# Altium schematic symbol library AA_Symbols.SchLib: 1017 symbols (part 3 of 7) (continued)
## IC_ADUM4160
designator U?, comment ADuM4160
IC, Isolator, USB, Full/Low Speed, 5kV; Manufacturer: Analog Devices; Manufacturer P/N: ADUM4160BRWZ; Outset P/N: 0000111
footprint SOIC_16PIN_WIDE (SOIC, 16-Leads, Body 10.5x7.6mm (max), Pitch 1.27mm, IPC Medium Density)
pins: 1 VBUS1, 2 GND1, 3 VDD1, 4 PDEN, 5 SPU, 6 UD-, 7 UD+, 8 GND1, 9 GND2, 10 DD+, 11 DD-, 12 PIN, 13 SPD, 14 VDD2, 15 GND2, 16 VBUS2

## IC_ADUM5000
designator U?, comment ADuM5000
IC, DC/DC Converter, Isolated, 2.5kV; Manufacturer: Analog Devices; Manufacturer P/N: ADUM5000ARWZ; Outset P/N: 0000112
footprint SOIC_16PIN_WIDE (SOIC, 16-Leads, Body 10.5x7.6mm (max), Pitch 1.27mm, IPC Medium Density)
pins: 1 VDD, 2 GND, 3 NC hidden, 4 RCin, 5 RCout, 6 RCsel, 7 VDD, 8 GND, 9 GNDiso, 10 Viso, 11 NC hidden, 12 NC hidden, 13 Vsel, 14 NC hidden, 15 GNDiso, 16 Viso

## IC_AK4432VT
designator U?, comment AK4432VT
IC, DAC/AUDIO 32BIT 192K 16TSSOP; Manufacturer P/N: LMZ14203HTZ/NOPB; Manufacturer: Texas Instruments; Outset P/N: PN-0001723; Value: AK4432VT
footprint SOP16P65_500X640X110L60X23N (Small Outline Pkg (SOP), 0.65 mm pitch; 16 pin, 5.00 mm L X 4.40 mm W X 1.10 mm H body)
pins: 1 MCLK (in), 2 BICK (in), 3 SDTI (in), 4 LRCK (in), 5 PDN (in), 6 SMUTE/CSN/I2CFIL (in), 7 AKS/CCLK/SCL (in), 8 DIF/CDTI/SDA, 9 P/S (in), 10 AOUTR (out), 11 AOUTL (out), 12 VCOM (out), 13 VSS (power), 14 AVDD (power), 15 LVDD (power), 16 LDOO (out)

## IC_AM26LV31IDR
designator U?, comment AM26LV31IDR
IC, 4/0 Driver RS422, RS485 16-SOIC; Manufacturer: Texas Instruments; Outset P/N: PN-0008395; Manufacturer P/N: AM26LV31IDR
footprint SOIC16P127_990X600X175L83X41N (Small Outline IC (SOIC), 1.27 mm pitch; 16 pin, 9.90 mm L X 3.90 mm W X 1.75 mm H body)
pins: 1 1A, 2 1Y, 3 1Z, 4 G, 5 2Z, 6 2Y, 7 2A, 8 VCC, 9 3A, 10 3Y, 11 3Z, 12 ~{G}, 13 4Z, 14 4Y, 15 4A, 16 GND

## IC_AM26LV31IDR_1
designator U?, comment AM26LV31IDR
IC, 4/0 Driver RS422, RS485 16-SOIC; Manufacturer: Texas Instruments; Manufacturer P/N: AM26LV31IDR
pins: 1 1A, 2 1Y, 3 1Z, 4 G, 5 2Z, 6 2Y, 7 2A, 8 VCC, 9 3A, 10 3Y, 11 3Z, 12 ~{G}, 13 4Z, 14 4Y, 15 4A, 16 GND

## IC_AP2112K-1.8TRG1
designator U?, comment AP2112K-1.8TRG1
IC, Linear Voltage Regulator IC Positive Fixed 1 Output 600mA SOT-25; Manufacturer: Diodes Incorporated; Outset P/N: PN-0008209; Value: AP2112K-1.8TRG1; Manufacturer P/N: AP2112K-1.8TRG1
footprint SOT23-5P95_285X140L45X42N (Small Outline Transistor, SOT-23 Type, 0.95 mm pitch; 5 pin, 3.00 mm L X 1.60 mm W X 1.40 mm H body)
pins: 1 VIN (power), 2 GND (power) "CH A", 3 EN (in), 4 NC, 5 VOUT (power) "GND"

## IC_AP7361C-Y5-13
designator U?, comment AP7361C-Y5-13
IC, Linear Regulator, Pos Adj, 1A, SOT89-5; Manufacturer: Diodes Incorporated; Outset P/N: PN-0007151; Manufacturer P/N: AP7361C-Y5-13; VALUE: AP7361C-Y5-13
footprint SOT89-5_Diodes_Inc_MFR
pins: 1 EN, 2 GND (power), 3 ADJ/NC, 4 VIN, 5 VOUT

## IC_AP22814AW5-7
designator U?, comment AP22814AW5-7
IC, Power Switch/Driver 1:1 P-Channel 3A SOT-25; Manufacturer: Diodes Inc; Outset P/N: PN-0007409; Manufacturer P/N: AP22814AW5-7; Value: AP22814AW5-7
footprint SOT23-5P95_280X145L45X40N (DBV_MO-178) (Small Outline Transistor (SOT23), 0.95 mm pitch; 5 pin, 2.90 mm L X 1.60 mm W X 1.45 mm H body)
pins: 1 OUT (power), 2 GND (power), 3 FLG, 4 EN, 5 IN (power)

## IC_BMP390
designator U?, comment BMP390
IC, SENSOR PRESSURE ABS; Manufacturer: Bosch Sensortec; Outset P/N: PN-0007204; VALUE: BMP390; Manufacturer P/N: BMP390
footprint PQFN10_BMP390 (Pull-back QFN)
pins: 1 VDDIO (power), 2 SCK (in), 3 VSS (power), 4 SDI (in), 5 SDO (out), 6 CSB (in), 7 INT (out), 8 VSS (power), 9 VSS (power), 10 VDD (power)

## IC_CAT25080YI-GT3
designator U?, comment CAT25080YI-GT3
IC, EEPROM 8Kbit, SPI, 20MHZ, 8TSSOP; Manufacturer: Onsemi; Outset P/N: PN-0007144; Manufacturer P/N: CAT25080YI-GT3; VALUE: CAT25080YI-GT3
footprint SOP8P65_300X640X120L62X24N (PW_MO-153AA)
pins: 1 ~{CS}, 2 SO (out), 3 ~{WP}, 4 VSS (power), 5 SI (in), 6 SCK, 7 ~{HOLD} (in), 8 VCC (power)

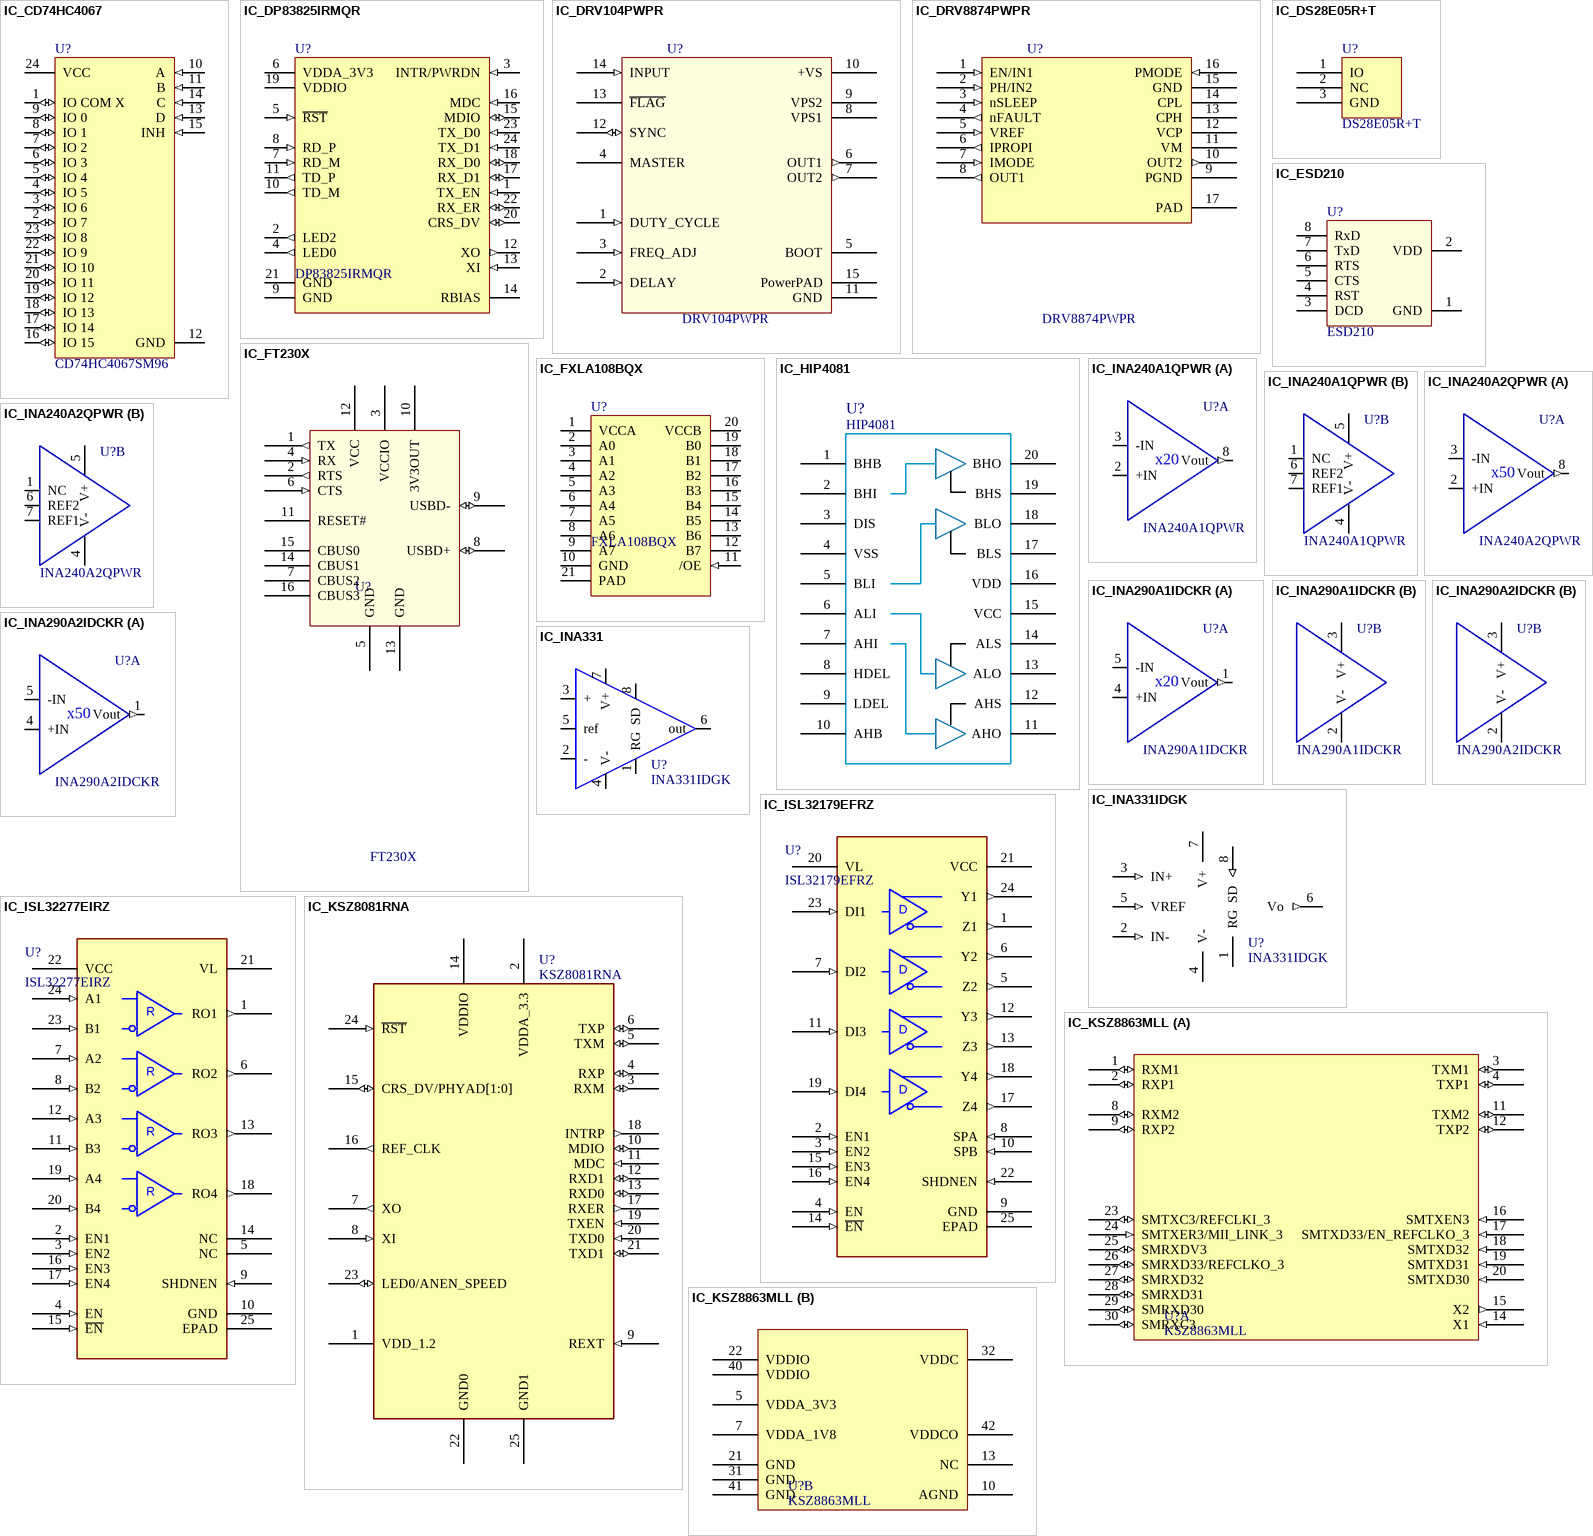
[diagram p18: symbols IC_CD74HC4067 to IC_KSZ8863MLL]

## IC_CD74HC4067
designator U?, comment CD74HC4067SM96
IC, Analog Multiplexer/Demultiplexer, 16:1; Manufacturer: Texas Instruments; Outset P/N: 0000113; Manufacturer P/N: CD74HC4067SM96
footprint SSOP_24PIN (SSOP, 24-Leads, Body 8.5x5.6mm (max), Pitch 0.65mm, IPC Medium Density)
pins: 1 IO COM X (io), 2 IO 7 (io), 3 IO 6 (io), 4 IO 5 (io), 5 IO 4 (io), 6 IO 3 (io), 7 IO 2 (io), 8 IO 1 (io), 9 IO 0 (io), 10 A (in), 11 B (in), 12 GND (power), 13 D (in), 14 C (in), 15 INH (in), 16 IO 15 (io), 17 IO 14 (io), 18 IO 13 (io), 19 IO 12 (io), 20 IO 11 (io), 21 IO 10 (io), 22 IO 9 (io), 23 IO 8 (io), 24 VCC (power)

## IC_DP83825IRMQR
designator U?, comment DP83825IRMQR
IC, 1/1 Transceiver Full, Half Ethernet, IEEE 802.3 24-WQFN (3x3); Manufacturer: Texas Instruments; Outset P/N: PN-0008210; Manufacturer P/N: DP83825IRMQR; Value: DP83825IRMQR
footprint QFN_DP83825IRMQR
pins: 1 TX_EN (in), 2 LED2 (out), 3 INTR/PWRDN (in), 4 LED0 (out), 5 ~{RST} (in), 6 VDDA_3V3 (power), 7 RD_M (in), 8 RD_P (in), 9 GND (power), 10 TD_M (out), 11 TD_P (out), 12 XO (out), 13 XI (in), 14 RBIAS, 15 MDIO (io), 16 MDC (in), 17 RX_D1 (io), 18 RX_D0 (io), 19 VDDIO (power), 20 CRS_DV (io), 21 GND (power), 22 RX_ER (io), 23 TX_D0 (in), 24 TX_D1 (in)

## IC_DRV104PWPR
designator U?, comment DRV104PWPR
IC, High-Side Driver, DRV104PWPR, 14-TSSOP; Manufacturer: Texas Instruments; Outset P/N: PN-0001646; Manufacturer P/N: DRV104PWPR; Value: DRV104PWPR
footprint DRV104PWPR_SOP65P640X120-15L25T246X231N (TSSOP, 24-Leads, Body 7.9x4.5mm (max), Pitch 0.65mm, IPC Medium Density)
pins: 1 DUTY_CYCLE (in), 2 DELAY (in), 3 FREQ_ADJ (in), 4 MASTER, 5 BOOT (power), 6 OUT1 (out), 7 OUT2 (out), 8 VPS1 (power), 9 VPS2 (power), 10 +VS (power), 11 GND (power), 12 SYNC (io), 13 ~{FLAG} (oc), 14 INPUT (in), 15 PowerPAD (power)

## IC_DRV8874PWPR
designator U?, comment DRV8874PWPR
IC, Bipolar Motor Driver NMOS PWM 16-HTSSOP; Manufacturer: Texas Instruments; Manufacturer P/N: DRV8874PWPR; Value: DRV8874PWPR
footprint SOP17P65_500X640X120L62X24T311X210N (Small Outline Pkg (SOP) with Thermal Tab, 0.65 mm pitch; 16 pin, 5.00 mm L X 4.40 mm W X 1.20 mm H body)
pins: 1 EN/IN1 (in), 2 PH/IN2 (in), 3 nSLEEP (in), 4 nFAULT (out), 5 VREF (in), 6 IPROPI (out), 7 IMODE (in), 8 OUT1 (out), 9 PGND (power), 10 OUT2 (out), 11 VM (power), 12 VCP (power), 13 CPH (power), 14 CPL (power), 15 GND (power), 16 PMODE (in), 17 PAD (power)

## IC_DS28E05R+T
designator U?, comment DS28E05R+T
IC, Single Wire EEPROM, DS28E05R+T, SOT-23; Manufacturer: Maxim; Outset P/N: PN-0001747; Manufacturer P/N: DS28E05R+T; Value: DS28E05R+T
footprint DS28E05R+T_SOT95P237X110-3L20N (Small Outline Transistor (SOT23), 0.95 mm pitch; 3 pin, 2.92 mm L X 1.30 mm W X 1.10 mm H body)
pins: 1 IO, 2 NC, 3 GND

## IC_ESD210
designator U?, comment ESD210
IC, Bluetooth Module; Manufacturer: Sena; Outset P/N: 0000114; Manufacturer P/N: ESD210
footprint ESD210
pins: 1 GND, 2 VDD, 3 DCD, 4 RST, 5 CTS, 6 RTS, 7 TxD, 8 RxD

## IC_FT230X
designator U?, comment FT230X
IC, USB to RS-232 Converter, FTDI, SSOP-16; Manufacturer P/N: FT230XS; Value: FT230XS; Outset P/N: PN-0004125; Manufacturer: FTDI; Supplier 1: Digi-Key; Supplier Part Number 1: 768-1154-5-ND
footprint TSSOP_16PIN (TSSOP, 16-Leads, Body 5.1x4.5mm (max), Pitch 0.65mm, IPC Medium Density)
pins: 1 TX (out), 2 RTS (out), 3 VCCIO (power), 4 RX (in), 5 GND (power), 6 CTS (in), 7 CBUS2, 8 USBD+ (io), 9 USBD- (io), 10 3V3OUT, 11 RESET# (power), 12 VCC (power), 13 GND (power), 14 CBUS1, 15 CBUS0, 16 CBUS3

## IC_FXLA108BQX
designator U?, comment FXLA108BQX
IC, Voltage Level Translator Bidirectional 1 Circuit 8 Channel 140Mbps 20-DQFN (2.5x4.5); Manufacturer: onsemi; Outset P/N: PN-0008275; Manufacturer P/N: FXLA108BQX; Value: FXLA108BQX
footprint QFN21P50_450X250X80L38X24T290X100 (Quad Flat No-Lead (QFN) with Thermal Tab, 0.50 mm pitch;  rect., 8 pin X 2 pin, 4.50 mm L X 2.50 mm W X 0.80 mm H body)
pins: 1 VCCA (power), 2 A0, 3 A1, 4 A2, 5 A3, 6 A4, 7 A5, 8 A6, 9 A7, 10 GND (power), 11 /OE (in), 12 B7, 13 B6, 14 B5, 15 B4, 16 B3, 17 B2, 18 B1, 19 B0, 20 VCCB (power), 21 PAD (power)

## IC_HIP4081
designator U?, comment HIP4081
IC, H-Bridge Driver, HIP4081, SOIC20W; Manufacturer: Intersil; Manufacturer P/N: HIP4081AIB; Outset P/N: 0000115
footprint SOIC_20PIN_WIDE
pins: 1 BHB, 2 BHI, 3 DIS, 4 VSS, 5 BLI, 6 ALI, 7 AHI, 8 HDEL, 9 LDEL, 10 AHB, 11 AHO, 12 AHS, 13 ALO, 14 ALS, 15 VCC, 16 VDD, 17 BLS, 18 BLO, 19 BHS, 20 BHO

## IC_INA240A1QPWR
designator U?, comment INA240A1QPWR
IC, Current Sense Amplifier, INA240A1QPWR, 1 Circuit, 8-TSSOP; Manufacturer: Texas Instruments; Outset P/N: PN-0007405; Manufacturer P/N: INA240A1QPWR; VALUE: INA240A1QPWR
footprint SOP65P640X120-8N (MO-153-AA)
part A pins: 2 +IN, 3 -IN, 8 Vout (out)
part B pins: 1 NC (power), 4 V- (power), 5 V+ (power), 6 REF2, 7 REF1
part A text: x20

## IC_INA240A2QPWR
designator U?, comment INA240A2QPWR
IC, Current Sense Amplifier, INA240A2QPWR, 1 Circuit, 8-TSSOP; Manufacturer: Texas Instruments; Outset P/N: PN-0007130; Manufacturer P/N: INA240A2QPWR; VALUE: INA240A2QPWR
footprint SOP65P640X120-8N (MO-153-AA)
part A pins: 2 +IN, 3 -IN, 8 Vout (out)
part B pins: 1 NC (power), 4 V- (power), 5 V+ (power), 6 REF2, 7 REF1
part A text: x50

## IC_INA290A1IDCKR
designator U?, comment INA290A1IDCKR
IC, Current Sense Amplifier, INA290A1IDCKR, 1 Circuit, SC-70-5; Manufacturer: Texas Instruments; Outset P/N: PN-0007530; Manufacturer P/N: INA290A1IDCKR; VALUE: INA290A1IDCKR
footprint SC70-5
part A pins: 1 Vout (out), 4 +IN, 5 -IN
part B pins: 2 V- (power), 3 V+ (power)
part A text: x20

## IC_INA290A2IDCKR
designator U?, comment INA290A2IDCKR
IC, Current Sense Amplifier, INA290AI2DCKR, 1 Circuit, SC-70-5; Manufacturer: Texas Instruments; Outset P/N: PN-0007529; Manufacturer P/N: INA290A2IDCKR; VALUE: INA290A2IDCKR
footprint SC70-5
part A pins: 1 Vout (out), 4 +IN, 5 -IN
part B pins: 2 V- (power), 3 V+ (power)
part A text: x50

## IC_INA331
designator U?, comment INA331IDGK
IC, Instrumentation Amp, Low Power, Single Supply, CMOS; Manufacturer: Texas Instruments; Manufacturer P/N: INA331IDGKT; Outset P/N: 0000117
footprint MSOP_8PIN (MSOP, 8-Leads, Body 3.1x3.1mm (max), Pitch 0.65mm, IPC Medium Density)
pins: 1 RG, 2 -, 3 +, 4 V-, 5 ref, 6 out, 7 V+, 8 SD

## IC_INA331IDGK
designator U?, comment INA331IDGK
IC, INST AMP 1 CIRCUIT 8VSSOP; MFG: Texas Instruments; Outset P/N: 0000117; TEMPERATURE: -55 ~ 125; MFG_PART_NO: INA331IDGK; VALUE: INA331IDGK
footprint SOP65P490X110-8N (MO-187-AA)
pins: 1 RG, 2 IN- (in), 3 IN+ (in), 4 V- (power), 5 VREF (in), 6 Vo (out), 7 V+ (power), 8 SD (in)

## IC_ISL32179EFRZ
designator U?, comment ISL32179EFRZ
4 Driver RS422, RS485 24-QFN (4x4); Manufacturer: Renesas Electronics; Outset P/N: PN-0008321; Manufacturer P/N: ISL32179EFRZ; Value: ISL32179EFRZ; ClassName: *; NOSTUFF: *
footprint QFN24_2P50X2P50_INR
footprint QFN25P50_400X400X100L40X25T245N (RGE_B) (Quad Flat No-Lead (QFN with Tab), 0.50 mm pitch; square, 6 pin X 6 pin, 4.00 mm L X 4.00 mm W X 1.00 mm H body)
pins: 1 Z1 (out), 2 EN1 (in), 3 EN2 (in), 4 EN (in), 5 Z2 (out), 6 Y2 (out), 7 DI2 (in), 8 SPA (in), 9 GND (power), 10 SPB (in), 11 DI3 (in), 12 Y3 (out), 13 Z3 (out), 14 ~{EN} (in), 15 EN3 (in), 16 EN4 (in), 17 Z4 (out), 18 Y4 (out), 19 DI4 (in), 20 VL (power), 21 VCC (power), 22 SHDNEN (in), 23 DI1 (in), 24 Y1 (out), 25 EPAD
text: D

## IC_ISL32277EIRZ
designator U?, comment ISL32277EIRZ
4 Receiver RS422, RS485 24-QFN (4x4); Manufacturer: Renesas Electronics; Outset P/N: PN-0008322; Manufacturer P/N: ISL32277EIRZ; Value: ISL32277EIRZ; ClassName: *
footprint QFN24_2P50X2P50_INR
footprint QFN25P50_400X400X100L40X25T245N (RGE_B) (Quad Flat No-Lead (QFN with Tab), 0.50 mm pitch; square, 6 pin X 6 pin, 4.00 mm L X 4.00 mm W X 1.00 mm H body)
pins: 1 RO1 (out), 2 EN1 (in), 3 EN2 (in), 4 EN (in), 5 NC, 6 RO2 (out), 7 A2 (in), 8 B2 (in), 9 SHDNEN (in), 10 GND (power), 11 B3 (in), 12 A3 (in), 13 RO3 (out), 14 NC, 15 ~{EN} (in), 16 EN3 (in), 17 EN4 (in), 18 RO4 (out), 19 A4 (in), 20 B4 (in), 21 VL (power), 22 VCC (power), 23 B1 (in), 24 A1 (in), 25 EPAD (power)
text: R

## IC_KSZ8081RNA
designator U?, comment KSZ8081RNA
IC, Transceiver, Full RMII, 1/1, 24-QFN (4x4); Manufacturer: Microchip; Outset P/N: PN-0007152; Manufacturer P/N: KSZ8081RNA; VALUE: KSZ8081RNA
footprint QFN50P400X400X90-25N
pins: 1 VDD_1.2 (power), 2 VDDA_3.3 (power), 3 RXM (io), 4 RXP (io), 5 TXM (io), 6 TXP (io), 7 XO (out), 8 XI (in), 9 REXT (in), 10 MDIO (io), 11 MDC (in), 12 RXD1 (io), 13 RXD0 (io), 14 VDDIO (power), 15 CRS_DV/PHYAD[1:0] (io), 16 REF_CLK (out), 17 RXER (out), 18 INTRP (out), 19 TXEN (in), 20 TXD0 (in), 21 TXD1 (io), 22 GND0 (power), 23 LED0/ANEN_SPEED (io), 24 ~{RST} (in), 25 GND1 (power) "Paddle"

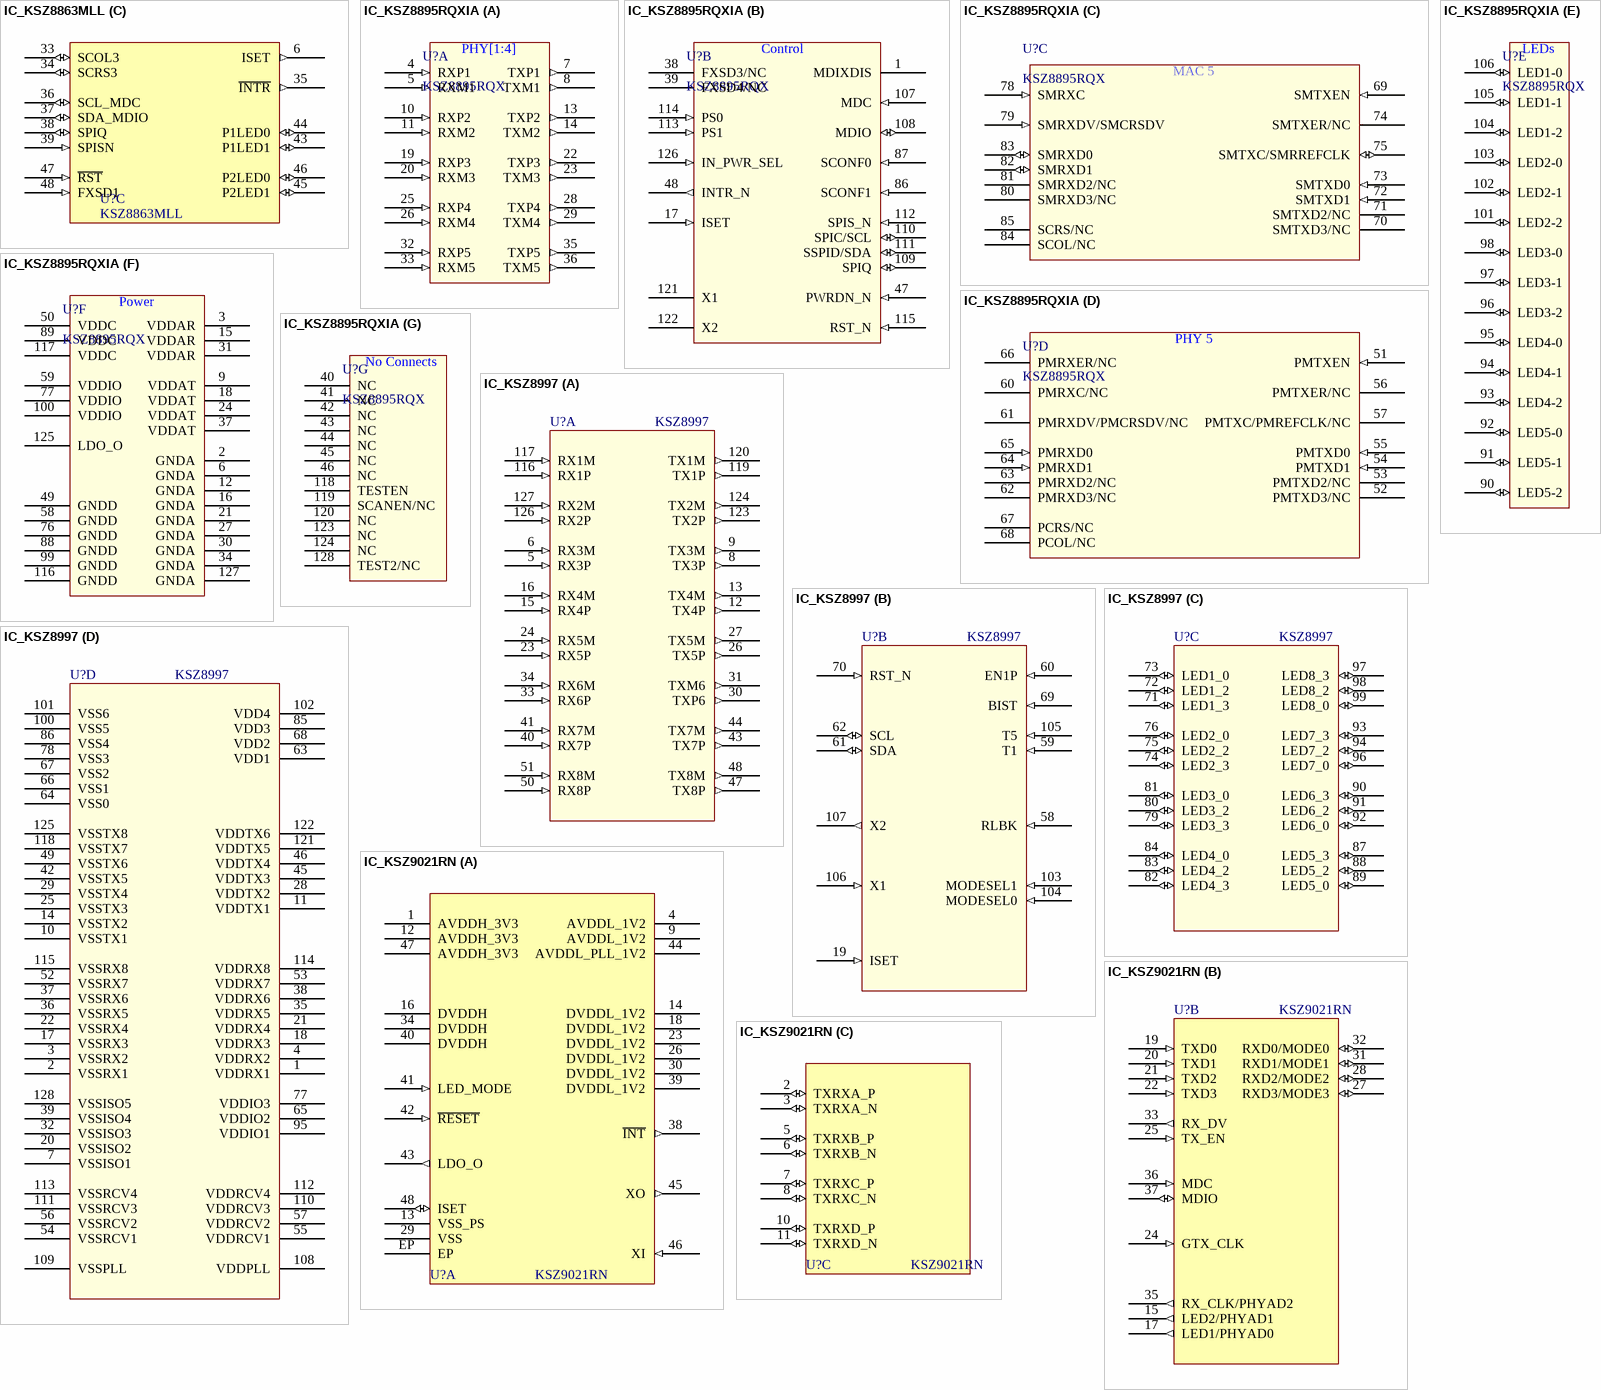
[diagram p19: symbols IC_KSZ8863MLL to IC_KSZ9021RN]

## IC_KSZ8863MLL
designator U?, comment KSZ8863MLL
IC, Transceiver Full Ethernet 36-HVQFN (6x6); Manufacturer: NXP USA Inc.; Manufacturer P/N: KSZ8863MLL
part A pins: 1 RXM1 (io), 2 RXP1 (io), 3 TXM1 (io), 4 TXP1 (io), 8 RXM2 (io), 9 RXP2 (io), 11 TXM2 (io), 12 TXP2 (io), 14 X1 (in), 15 X2 (out), 16 SMTXEN3 (in), 17 SMTXD33/EN_REFCLKO_3 (in), 18 SMTXD32 (in), 19 SMTXD31 (in), 20 SMTXD30 (in), 23 SMTXC3/REFCLKI_3 (io), 24 SMTXER3/MII_LINK_3 (in), 25 SMRXDV3 (io), 26 SMRXD33/REFCLKO_3 (io), 27 SMRXD32 (io), 28 SMRXD31 (io), 29 SMRXD30 (io), 30 SMRXC3 (io)
part B pins: 5 VDDA_3V3 (power), 7 VDDA_1V8 (power), 10 AGND (power), 13 NC, 21 GND (power), 22 VDDIO (power), 31 GND (power), 32 VDDC (power), 40 VDDIO (power), 41 GND (power), 42 VDDCO (power)
part C pins: 6 ISET (out), 33 SCOL3 (io), 34 SCRS3 (io), 35 ~{INTR} (out), 36 SCL_MDC (io), 37 SDA_MDIO (io), 38 SPIQ (io), 39 SPISN (in), 43 P1LED1 (io), 44 P1LED0 (io), 45 P2LED1 (io), 46 P2LED0 (io), 47 ~{RST} (in), 48 FXSD1 (in)

## IC_KSZ8895RQXIA
designator U?, comment KSZ8895RQX
IC, Switch 10/100 5 Port, KSZ8895RQXIA, 128-PQFP; Manufacturer: Microchip Technology; Outset P/N: PN-0001660; Value: KSZ8895RQXIA; Manufacturer P/N: KSZ8895RQXIA
footprint KSZ8997_PQFP50P2320X1720X340-128L30N (Quad Flat Pack (QFP), 0.50 mm pitch; rect., 38 pin X 26 pin, 20.00 mm L X 14.00 mm W X 3.40 mm H body)
part A pins: 4 RXP1 (in), 5 RXM1 (in), 7 TXP1 (out), 8 TXM1 (out), 10 RXP2 (in), 11 RXM2 (in), 13 TXP2 (out), 14 TXM2 (out), 19 RXP3 (in), 20 RXM3 (in), 22 TXP3 (out), 23 TXM3 (out), 25 RXP4 (in), 26 RXM4 (in), 28 TXP4 (out), 29 TXM4 (out), 32 RXP5 (in), 33 RXM5 (in), 35 TXP5 (out), 36 TXM5 (out)
part B pins: 1 MDIXDIS, 17 ISET (in), 38 FXSD3/NC, 39 FXSD4/NC, 47 PWRDN_N (in), 48 INTR_N (out), 86 SCONF1 (in), 87 SCONF0 (in), 107 MDC (in), 108 MDIO (io), 109 SPIQ (io), 110 SPIC/SCL (io), 111 SSPID/SDA (io), 112 SPIS_N (in), 113 PS1 (in), 114 PS0 (in), 115 RST_N (in), 121 X1, 122 X2, 126 IN_PWR_SEL (in)
part C pins: 69 SMTXEN (in), 70 SMTXD3/NC, 71 SMTXD2/NC, 72 SMTXD1 (in), 73 SMTXD0 (in), 74 SMTXER/NC, 75 SMTXC/SMRREFCLK (io), 78 SMRXC (in), 79 SMRXDV/SMCRSDV (in), 80 SMRXD3/NC, 81 SMRXD2/NC, 82 SMRXD1 (io), 83 SMRXD0 (io), 84 SCOL/NC, 85 SCRS/NC
part D pins: 51 PMTXEN (in), 52 PMTXD3/NC, 53 PMTXD2/NC, 54 PMTXD1 (in), 55 PMTXD0 (in), 56 PMTXER/NC, 57 PMTXC/PMREFCLK/NC, 60 PMRXC/NC, 61 PMRXDV/PMCRSDV/NC, 62 PMRXD3/NC, 63 PMRXD2/NC, 64 PMRXD1 (in), 65 PMRXD0 (in), 66 PMRXER/NC, 67 PCRS/NC, 68 PCOL/NC
part E pins: 90 LED5-2 (io), 91 LED5-1 (io), 92 LED5-0 (io), 93 LED4-2 (io), 94 LED4-1 (io), 95 LED4-0 (io), 96 LED3-2 (io), 97 LED3-1 (io), 98 LED3-0 (io), 101 LED2-2 (io), 102 LED2-1 (io), 103 LED2-0 (io), 104 LED1-2 (io), 105 LED1-1 (io), 106 LED1-0 (io)
part F pins: 2 GNDA (power), 3 VDDAR (power), 6 GNDA (power), 9 VDDAT (power), 12 GNDA (power), 15 VDDAR (power), 16 GNDA (power), 18 VDDAT (power), 21 GNDA (power), 24 VDDAT (power), 27 GNDA (power), 30 GNDA (power), 31 VDDAR (power), 34 GNDA (power), 37 VDDAT (power), 49 GNDD (power), 50 VDDC (power), 58 GNDD (power), 59 VDDIO (power), 76 GNDD (power), 77 VDDIO (power), 88 GNDD (power), 89 VDDC (power), 99 GNDD (power), 100 VDDIO (power), 116 GNDD (power), 117 VDDC (power), 125 LDO_O (power), 127 GNDA (power)
part G pins: 40 NC, 41 NC, 42 NC, 43 NC, 44 NC, 45 NC, 46 NC, 118 TESTEN, 119 SCANEN/NC, 120 NC, 123 NC, 124 NC, 128 TEST2/NC
part A text: PHY[1:4]
part B text: Control
part C text: MAC 5
part D text: PHY 5
part E text: LEDs
part F text: Power
part G text: No Connects

## IC_KSZ8997
designator U?, comment KSZ8997
IC, Switch 10/100 8 Port, KSZ8997, 128-TQFP; Manufacturer: Microchip Technology; Outset P/N: PN-0001647; Value: KSZ8997; Manufacturer P/N: KSZ8997
footprint KSZ8997_PQFP50P2320X1720X340-128L30N (Quad Flat Pack (QFP), 0.50 mm pitch; rect., 38 pin X 26 pin, 20.00 mm L X 14.00 mm W X 3.40 mm H body)
part A pins: 5 RX3P (in), 6 RX3M (in), 8 TX3P (out), 9 TX3M (out), 12 TX4P (out), 13 TX4M (out), 15 RX4P (in), 16 RX4M (in), 23 RX5P (in), 24 RX5M (in), 26 TX5P (out), 27 TX5M (out), 30 TXP6 (out), 31 TXM6 (out), 33 RX6P (in), 34 RX6M (in), 40 RX7P (in), 41 RX7M (in), 43 TX7P (out), 44 TX7M (out), 47 TX8P (out), 48 TX8M (out), 50 RX8P (in), 51 RX8M (in), 116 RX1P (in), 117 RX1M (in), 119 TX1P (out), 120 TX1M (out), 123 TX2P (out), 124 TX2M (out), 126 RX2P (in), 127 RX2M (in)
part B pins: 19 ISET (in), 58 RLBK (in), 59 T1 (in), 60 EN1P (in), 61 SDA (io), 62 SCL (io), 69 BIST (in), 70 RST_N (in), 103 MODESEL1 (in), 104 MODESEL0 (in), 105 T5 (in), 106 X1 (in), 107 X2 (out)
part C pins: 71 LED1_3 (io), 72 LED1_2 (io), 73 LED1_0 (io), 74 LED2_3 (io), 75 LED2_2 (io), 76 LED2_0 (io), 79 LED3_3 (io), 80 LED3_2 (io), 81 LED3_0 (io), 82 LED4_3 (io), 83 LED4_2 (io), 84 LED4_0 (io), 87 LED5_3 (io), 88 LED5_2 (io), 89 LED5_0 (io), 90 LED6_3 (io), 91 LED6_2 (io), 92 LED6_0 (io), 93 LED7_3 (io), 94 LED7_2 (io), 96 LED7_0 (io), 97 LED8_3 (io), 98 LED8_2 (io), 99 LED8_0 (io)
part D pins: 1 VDDRX1 (power), 2 VSSRX1 (power), 3 VSSRX2 (power), 4 VDDRX2 (power), 7 VSSISO1, 10 VSSTX1 (power), 11 VDDTX1 (power), 14 VSSTX2 (power), 17 VSSRX3 (power), 18 VDDRX3 (power), 20 VSSISO2 (power), 21 VDDRX4 (power), 22 VSSRX4 (power), 25 VSSTX3 (power), 28 VDDTX2 (power), 29 VSSTX4 (power), 32 VSSISO3, 35 VDDRX5 (power), 36 VSSRX5 (power), 37 VSSRX6 (power), 38 VDDRX6 (power), 39 VSSISO4 (power), 42 VSSTX5 (power), 45 VDDTX3 (power), 46 VDDTX4 (power), 49 VSSTX6 (power), 52 VSSRX7 (power), 53 VDDRX7 (power), 54 VSSRCV1 (power), 55 VDDRCV1 (power), 56 VSSRCV2 (power), 57 VDDRCV2 (power), 63 VDD1 (power), 64 VSS0 (power), 65 VDDIO2 (power), 66 VSS1 (power), 67 VSS2 (power), 68 VDD2 (power), 77 VDDIO3 (power), 78 VSS3 (power), 85 VDD3 (power), 86 VSS4 (power), 95 VDDIO1 (power), 100 VSS5 (power), 101 VSS6 (power), 102 VDD4 (power), 108 VDDPLL (power), 109 VSSPLL (power), 110 VDDRCV3 (power), 111 VSSRCV3 (power), 112 VDDRCV4 (power), 113 VSSRCV4 (power), 114 VDDRX8 (power), 115 VSSRX8 (power), 118 VSSTX7 (power), 121 VDDTX5 (power), 122 VDDTX6 (power), 125 VSSTX8 (power), 128 VSSISO5 (power)

## IC_KSZ9021RN
designator U?, comment KSZ9021RN
IC, 8/8 Transceiver Full Gigabit Ethernet 48-QFN (7x7); Manufacturer: Microchip Technology; Value: KSZ9021RN; Manufacturer P/N: KSZ9021RN
part A pins: 1 AVDDH_3V3 (power), 4 AVDDL_1V2 (power), 9 AVDDL_1V2 (power), 12 AVDDH_3V3 (power), 13 VSS_PS (power), 14 DVDDL_1V2 (power), 16 DVDDH (power), 18 DVDDL_1V2 (power), 23 DVDDL_1V2 (power), 26 DVDDL_1V2 (power), 29 VSS (power), 30 DVDDL_1V2 (power), 34 DVDDH (power), 38 ~{INT} (out), 39 DVDDL_1V2 (power), 40 DVDDH (power), 41 LED_MODE (in), 42 ~{RESET} (in), 43 LDO_O (out), 44 AVDDL_PLL_1V2 (power), 45 XO (out), 46 XI (in), 47 AVDDH_3V3 (power), 48 ISET (io), EP (power)
part B pins: 15 LED2/PHYAD1 (out), 17 LED1/PHYAD0 (out), 19 TXD0 (in), 20 TXD1 (in), 21 TXD2 (in), 22 TXD3 (in), 24 GTX_CLK (in), 25 TX_EN (in), 27 RXD3/MODE3 (io), 28 RXD2/MODE2 (io), 31 RXD1/MODE1 (io), 32 RXD0/MODE0 (io), 33 RX_DV (out), 35 RX_CLK/PHYAD2 (out), 36 MDC (in), 37 MDIO (io)
part C pins: 2 TXRXA_P (io), 3 TXRXA_N (io), 5 TXRXB_P (io), 6 TXRXB_N (io), 7 TXRXC_P (io), 8 TXRXC_N (io), 10 TXRXD_P (io), 11 TXRXD_N (io)

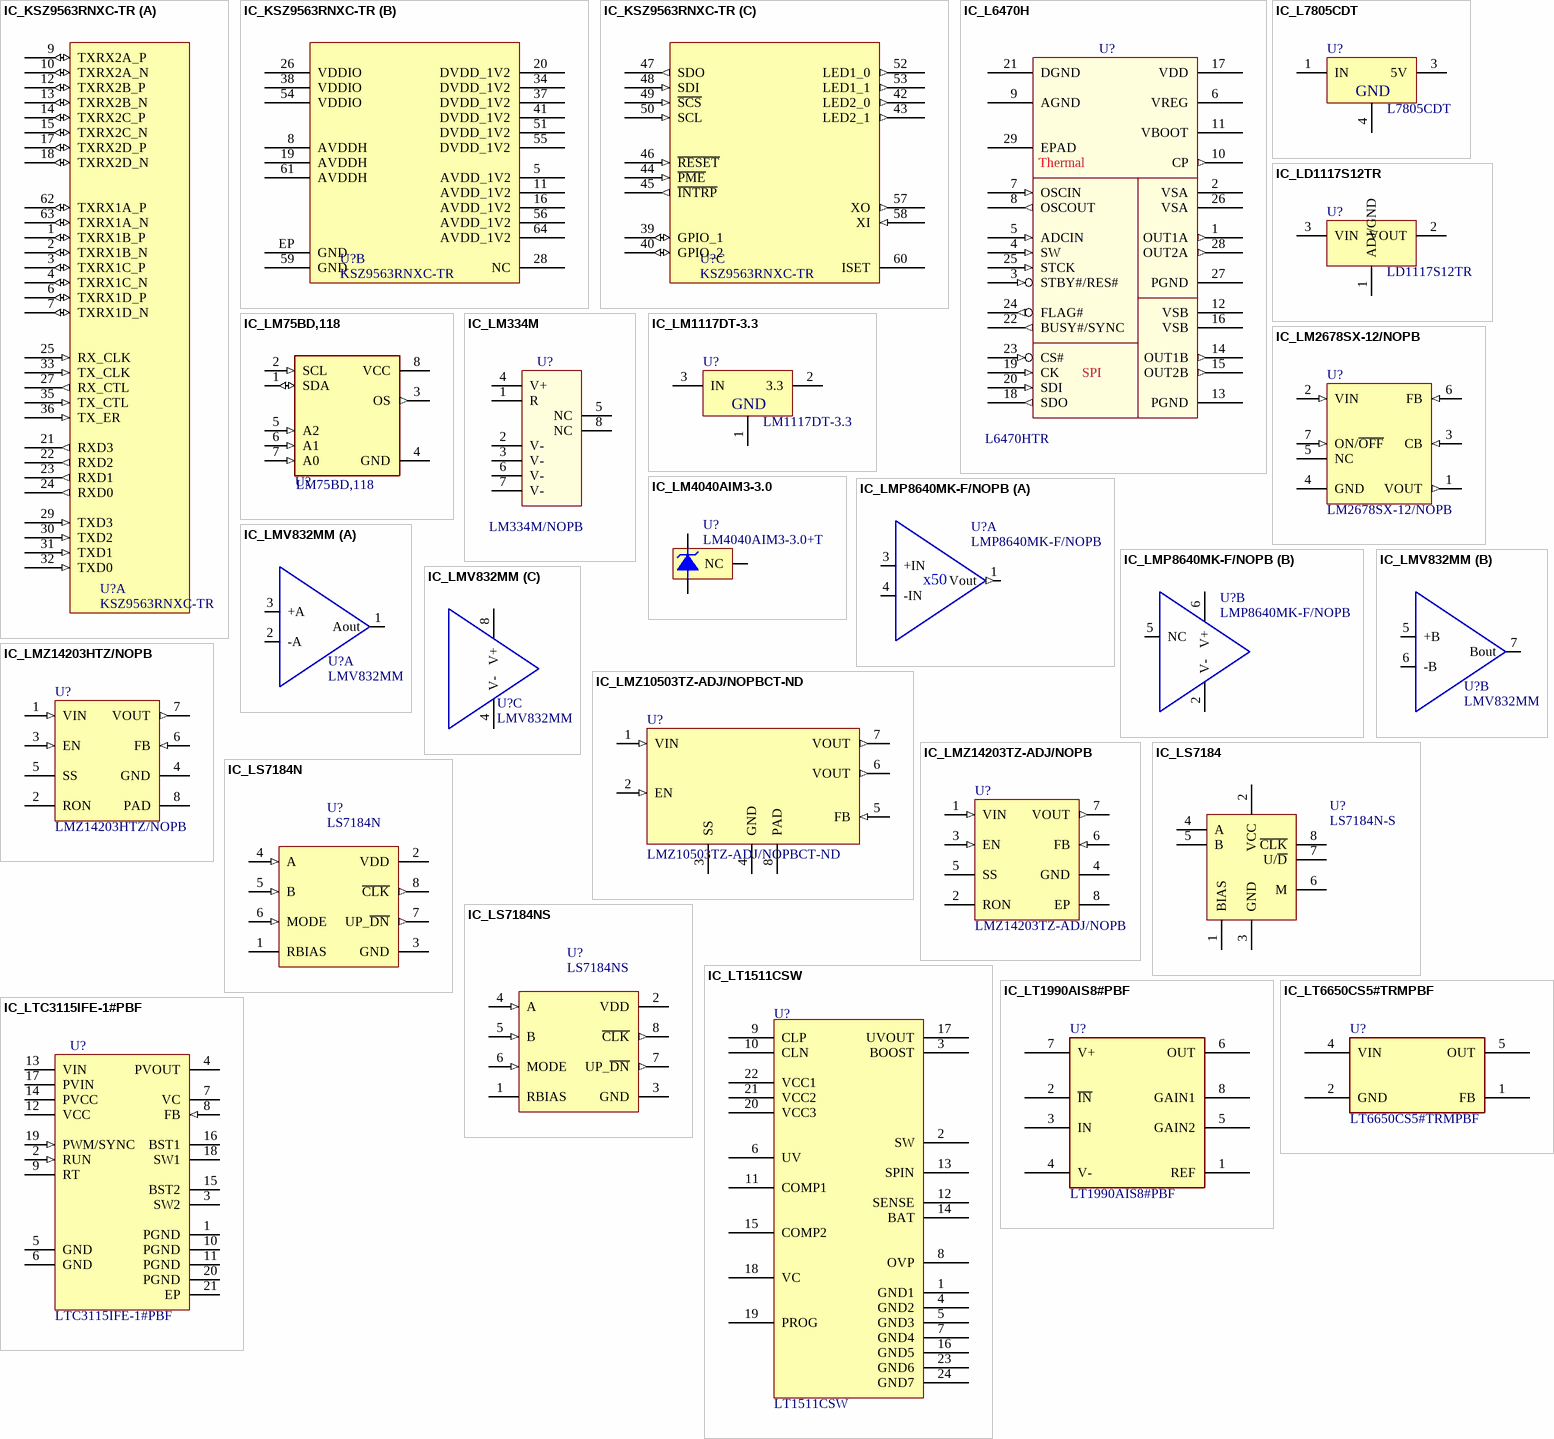
[diagram p20: symbols IC_KSZ9563RNXC-TR to IC_LTC3115IFE-1#PBF]